# Altium schematic symbol library ISSI SRAM ASynchronous SRAM High Speed Low Power.SchLib: 414 symbols (part 3 of 16)
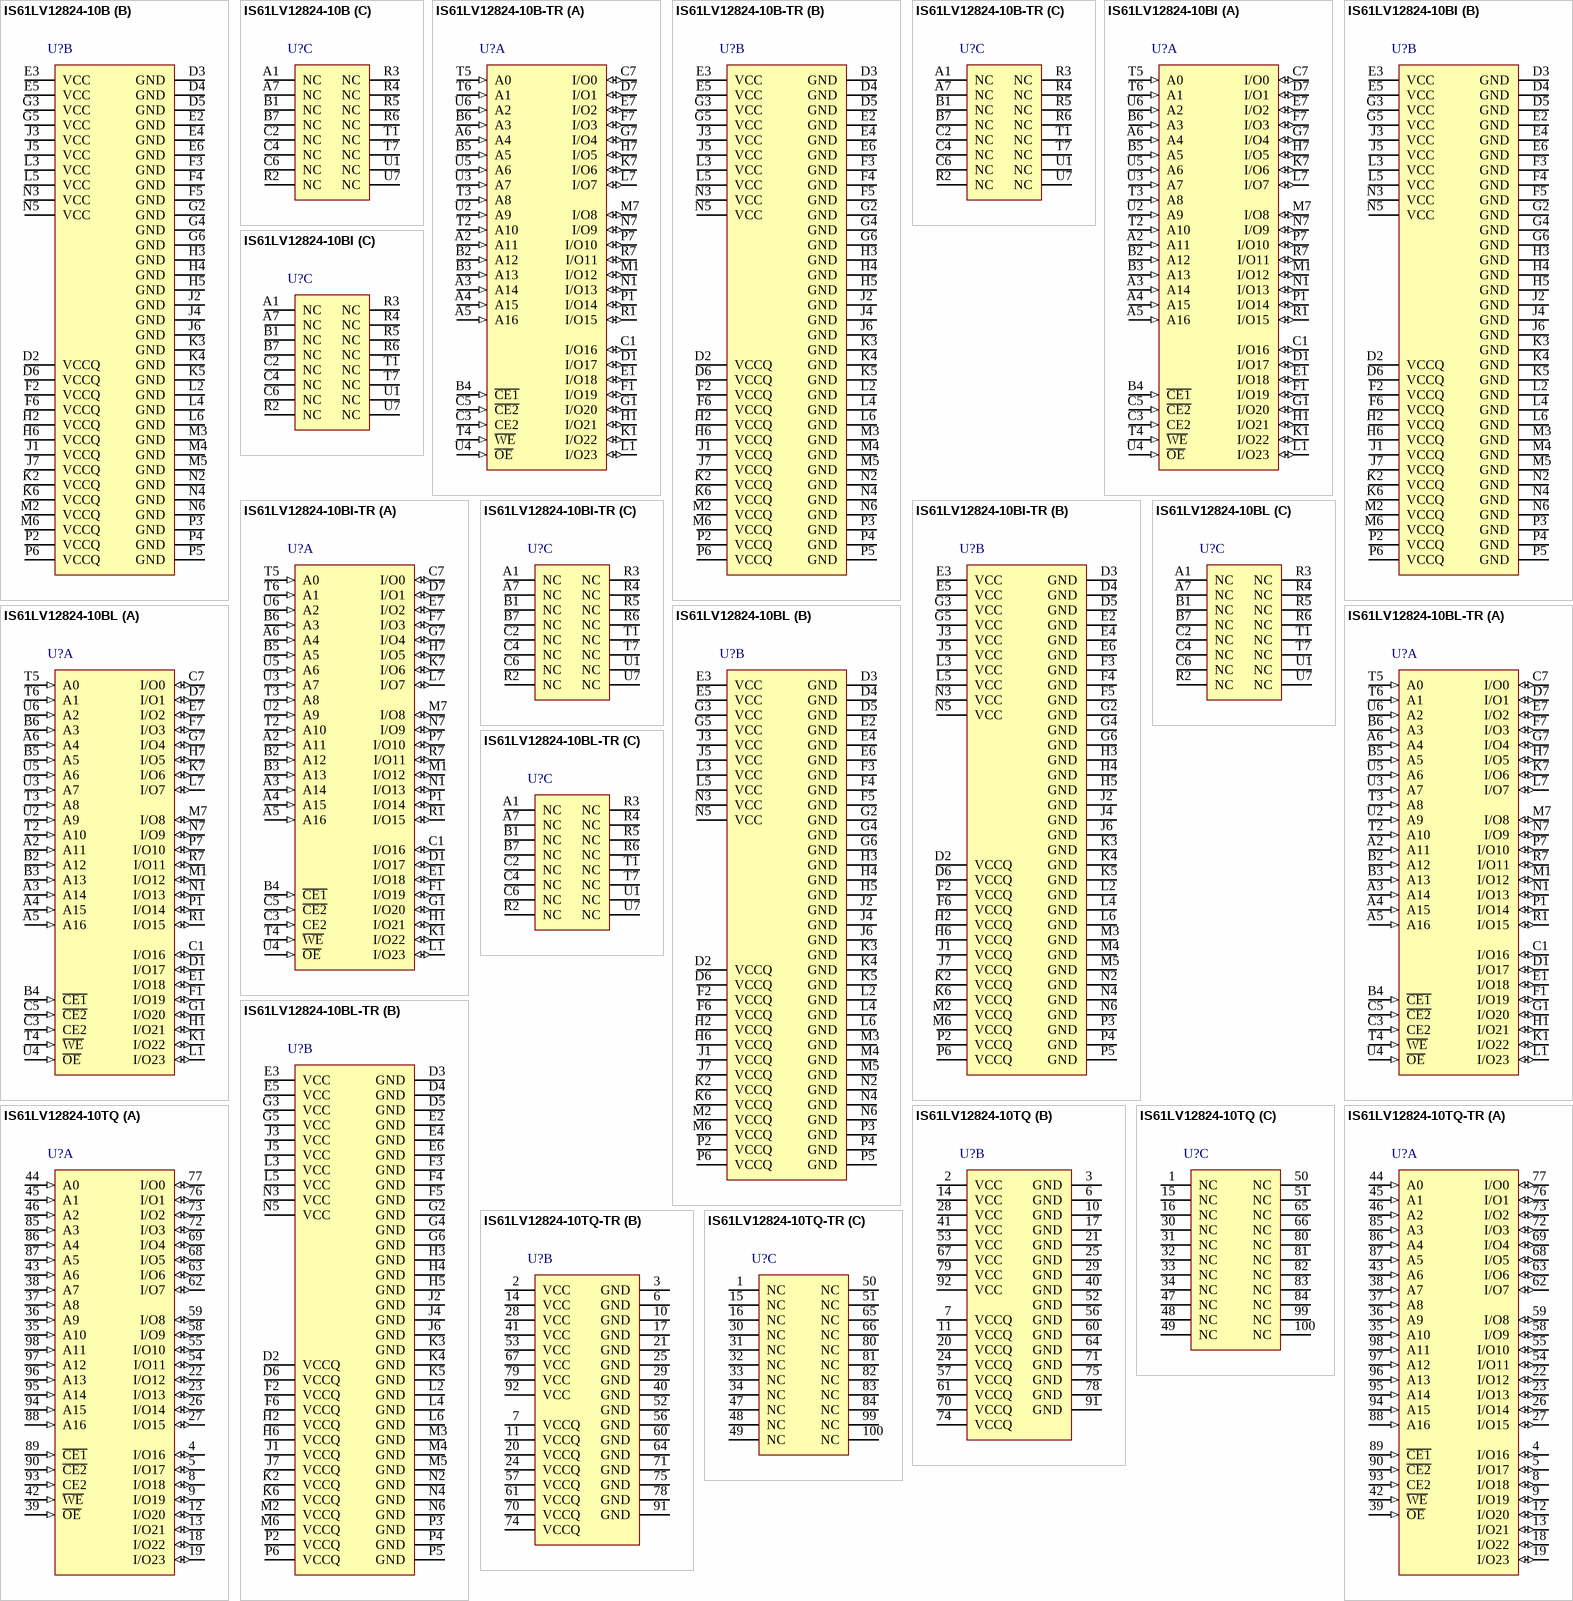
[diagram p30: symbols IS61LV12824-10B to IS61LV12824-10TQ-TR]

## IS61LV12824-10TQ
designator U?
3 M High Speed CMOS SRAM with 3.3 V Supply, 128 K x 24, 0 to 70 degC, 100-Pin QFP (TQFP-100); Manufacturer: Integrated Silicon Solution Inc (ISSI); PartNumber: IS61LV12824-10TQ; Density: 3M; Packing: Tray / Tube; Speed (ns): 10; DatasheetVersion: Rev. D; PackageVersion: Rev. F, 09/2009; PackageReference: TQFP-100; PackageDescription: 100-Pin 20 x 14 mm LQFP, Pitch 0.65 mm; Supplier 1: Digi-Key; Supplier Part Number 1: IS61LV12824-10TQ-ND; Supplier 2: Mouser; Supplier Part Number 2: 870-IS61LV12824-10TQ; Organization: 128K x 24; Mounting Technology: Surface Mount; ComponentLink1Description: Manufacturer URL; ComponentLink1URL: http://www.issi.com/US/index.shtml; ComponentLink2Description: Datasheet; ComponentLink2URL: http://www.issi.com/WW/pdf/61LV12824.pdf; ComponentLink3Description: Package Specification; ComponentLink3URL: http://www.issi.com/WW/pdf/61VPS_LPS25636A_51218A.pdf
footprint ISSI-TQFP-100-20000X14000DE_N (QFP, 100-Leads, Body 20x14mm, Pitch 0.65mm, IPC Medium Density)
part A pins: 4 I/O16 (io) "Data Input/Output", 5 I/O17 (io) "Data Input/Output", 8 I/O18 (io) "Data Input/Output", 9 I/O19 (io) "Data Input/Output", 12 I/O20 (io) "Data Input/Output", 13 I/O21 (io) "Data Input/Output", 18 I/O22 (io) "Data Input/Output", 19 I/O23 (io) "Data Input/Output", 22 I/O12 (io) "Data Input/Output", 23 I/O13 (io) "Data Input/Output", 26 I/O14 (io) "Data Input/Output", 27 I/O15 (io) "Data Input/Output", 35 A10 (in) "Address Input", 36 A9 (in) "Address Input", 37 A8 (in) "Address Input", 38 A7 (in) "Address Input", 39 ~{OE} (in) "Output Enable Input", 42 ~{WE} (in) "Write Enable Input", 43 A6 (in) "Address Input", 44 A0 (in) "Address Input", 45 A1 (in) "Address Input", 46 A2 (in) "Address Input", 54 I/O11 (io) "Data Input/Output", 55 I/O10 (io) "Data Input/Output", 58 I/O9 (io) "Data Input/Output", 59 I/O8 (io) "Data Input/Output", 62 I/O7 (io) "Data Input/Output", 63 I/O6 (io) "Data Input/Output", 68 I/O5 (io) "Data Input/Output", 69 I/O4 (io) "Data Input/Output", 72 I/O3 (io) "Data Input/Output", 73 I/O2 (io) "Data Input/Output", 76 I/O1 (io) "Data Input/Output", 77 I/O0 (io) "Data Input/Output", 85 A3 (in) "Address Input", 86 A4 (in) "Address Input", 87 A5 (in) "Address Input", 88 A16 (in) "Address Input", 89 ~{CE1} (in) "Chip Enable Input LOW", 90 ~{CE2} (in) "Chip Enable Input LOW", 93 CE2 (in) "Chip Enable Input HIGH", 94 A15 (in) "Address Input", 95 A14 (in) "Address Input", 96 A13 (in) "Address Input", 97 A12 (in) "Address Input", 98 A11 (in) "Address Input"
part B pins: 2 VCC (power) "Power", 3 GND (power) "Ground", 6 GND (power) "Ground", 7 VCCQ (power) "I/O Power", 10 GND (power) "Ground", 11 VCCQ (power) "I/O Power", 14 VCC (power) "Power", 17 GND (power) "Ground", 20 VCCQ (power) "I/O Power", 21 GND (power) "Ground", 24 VCCQ (power) "I/O Power", 25 GND (power) "Ground", 28 VCC (power) "Power", 29 GND (power) "Ground", 40 GND (power) "Ground", 41 VCC (power) "Power", 52 GND (power) "Ground", 53 VCC (power) "Power", 56 GND (power) "Ground", 57 VCCQ (power) "I/O Power", 60 GND (power) "Ground", 61 VCCQ (power) "I/O Power", 64 GND (power) "Ground", 67 VCC (power) "Power", 70 VCCQ (power) "I/O Power", 71 GND (power) "Ground", 74 VCCQ (power) "I/O Power", 75 GND (power) "Ground", 78 GND (power) "Ground", 79 VCC (power) "Power", 91 GND (power) "Ground", 92 VCC (power) "Power"
part C pins: 1 NC "No Connection", 15 NC "No Connection", 16 NC "No Connection", 30 NC "No Connection", 31 NC "No Connection", 32 NC "No Connection", 33 NC "No Connection", 34 NC "No Connection", 47 NC "No Connection", 48 NC "No Connection", 49 NC "No Connection", 50 NC "No Connection", 51 NC "No Connection", 65 NC "No Connection", 66 NC "No Connection", 80 NC "No Connection", 81 NC "No Connection", 82 NC "No Connection", 83 NC "No Connection", 84 NC "No Connection", 99 NC "No Connection", 100 NC "No Connection"

## IS61LV12824-10TQ-TR
designator U?
3 M High Speed CMOS SRAM with 3.3 V Supply, 128 K x 24, 0 to 70 degC, 100-Pin QFP (TQFP-100); Manufacturer: Integrated Silicon Solution Inc (ISSI); PartNumber: IS61LV12824-10TQ-TR; Density: 3M; Packing: Tape & Reel; Speed (ns): 10; DatasheetVersion: Rev. D; PackageVersion: Rev. F, 09/2009; PackageReference: TQFP-100; PackageDescription: 100-Pin 20 x 14 mm LQFP, Pitch 0.65 mm; Supplier 1: Digi-Key; Supplier Part Number 1: IS61LV12824-10TQ-TR-ND; Supplier 2: Mouser; Supplier Part Number 2: 870IS61LV1282410TQTR; Organization: 128K x 24; Mounting Technology: Surface Mount; ComponentLink1Description: Manufacturer URL; ComponentLink1URL: http://www.issi.com/US/index.shtml; ComponentLink2Description: Datasheet; ComponentLink2URL: http://www.issi.com/WW/pdf/61LV12824.pdf; ComponentLink3Description: Package Specification; ComponentLink3URL: http://www.issi.com/WW/pdf/61VPS_LPS25636A_51218A.pdf
footprint ISSI-TQFP-100-20000X14000DE_N (QFP, 100-Leads, Body 20x14mm, Pitch 0.65mm, IPC Medium Density)
part A pins: 4 I/O16 (io) "Data Input/Output", 5 I/O17 (io) "Data Input/Output", 8 I/O18 (io) "Data Input/Output", 9 I/O19 (io) "Data Input/Output", 12 I/O20 (io) "Data Input/Output", 13 I/O21 (io) "Data Input/Output", 18 I/O22 (io) "Data Input/Output", 19 I/O23 (io) "Data Input/Output", 22 I/O12 (io) "Data Input/Output", 23 I/O13 (io) "Data Input/Output", 26 I/O14 (io) "Data Input/Output", 27 I/O15 (io) "Data Input/Output", 35 A10 (in) "Address Input", 36 A9 (in) "Address Input", 37 A8 (in) "Address Input", 38 A7 (in) "Address Input", 39 ~{OE} (in) "Output Enable Input", 42 ~{WE} (in) "Write Enable Input", 43 A6 (in) "Address Input", 44 A0 (in) "Address Input", 45 A1 (in) "Address Input", 46 A2 (in) "Address Input", 54 I/O11 (io) "Data Input/Output", 55 I/O10 (io) "Data Input/Output", 58 I/O9 (io) "Data Input/Output", 59 I/O8 (io) "Data Input/Output", 62 I/O7 (io) "Data Input/Output", 63 I/O6 (io) "Data Input/Output", 68 I/O5 (io) "Data Input/Output", 69 I/O4 (io) "Data Input/Output", 72 I/O3 (io) "Data Input/Output", 73 I/O2 (io) "Data Input/Output", 76 I/O1 (io) "Data Input/Output", 77 I/O0 (io) "Data Input/Output", 85 A3 (in) "Address Input", 86 A4 (in) "Address Input", 87 A5 (in) "Address Input", 88 A16 (in) "Address Input", 89 ~{CE1} (in) "Chip Enable Input LOW", 90 ~{CE2} (in) "Chip Enable Input LOW", 93 CE2 (in) "Chip Enable Input HIGH", 94 A15 (in) "Address Input", 95 A14 (in) "Address Input", 96 A13 (in) "Address Input", 97 A12 (in) "Address Input", 98 A11 (in) "Address Input"
part B pins: 2 VCC (power) "Power", 3 GND (power) "Ground", 6 GND (power) "Ground", 7 VCCQ (power) "I/O Power", 10 GND (power) "Ground", 11 VCCQ (power) "I/O Power", 14 VCC (power) "Power", 17 GND (power) "Ground", 20 VCCQ (power) "I/O Power", 21 GND (power) "Ground", 24 VCCQ (power) "I/O Power", 25 GND (power) "Ground", 28 VCC (power) "Power", 29 GND (power) "Ground", 40 GND (power) "Ground", 41 VCC (power) "Power", 52 GND (power) "Ground", 53 VCC (power) "Power", 56 GND (power) "Ground", 57 VCCQ (power) "I/O Power", 60 GND (power) "Ground", 61 VCCQ (power) "I/O Power", 64 GND (power) "Ground", 67 VCC (power) "Power", 70 VCCQ (power) "I/O Power", 71 GND (power) "Ground", 74 VCCQ (power) "I/O Power", 75 GND (power) "Ground", 78 GND (power) "Ground", 79 VCC (power) "Power", 91 GND (power) "Ground", 92 VCC (power) "Power"
part C pins: 1 NC "No Connection", 15 NC "No Connection", 16 NC "No Connection", 30 NC "No Connection", 31 NC "No Connection", 32 NC "No Connection", 33 NC "No Connection", 34 NC "No Connection", 47 NC "No Connection", 48 NC "No Connection", 49 NC "No Connection", 50 NC "No Connection", 51 NC "No Connection", 65 NC "No Connection", 66 NC "No Connection", 80 NC "No Connection", 81 NC "No Connection", 82 NC "No Connection", 83 NC "No Connection", 84 NC "No Connection", 99 NC "No Connection", 100 NC "No Connection"

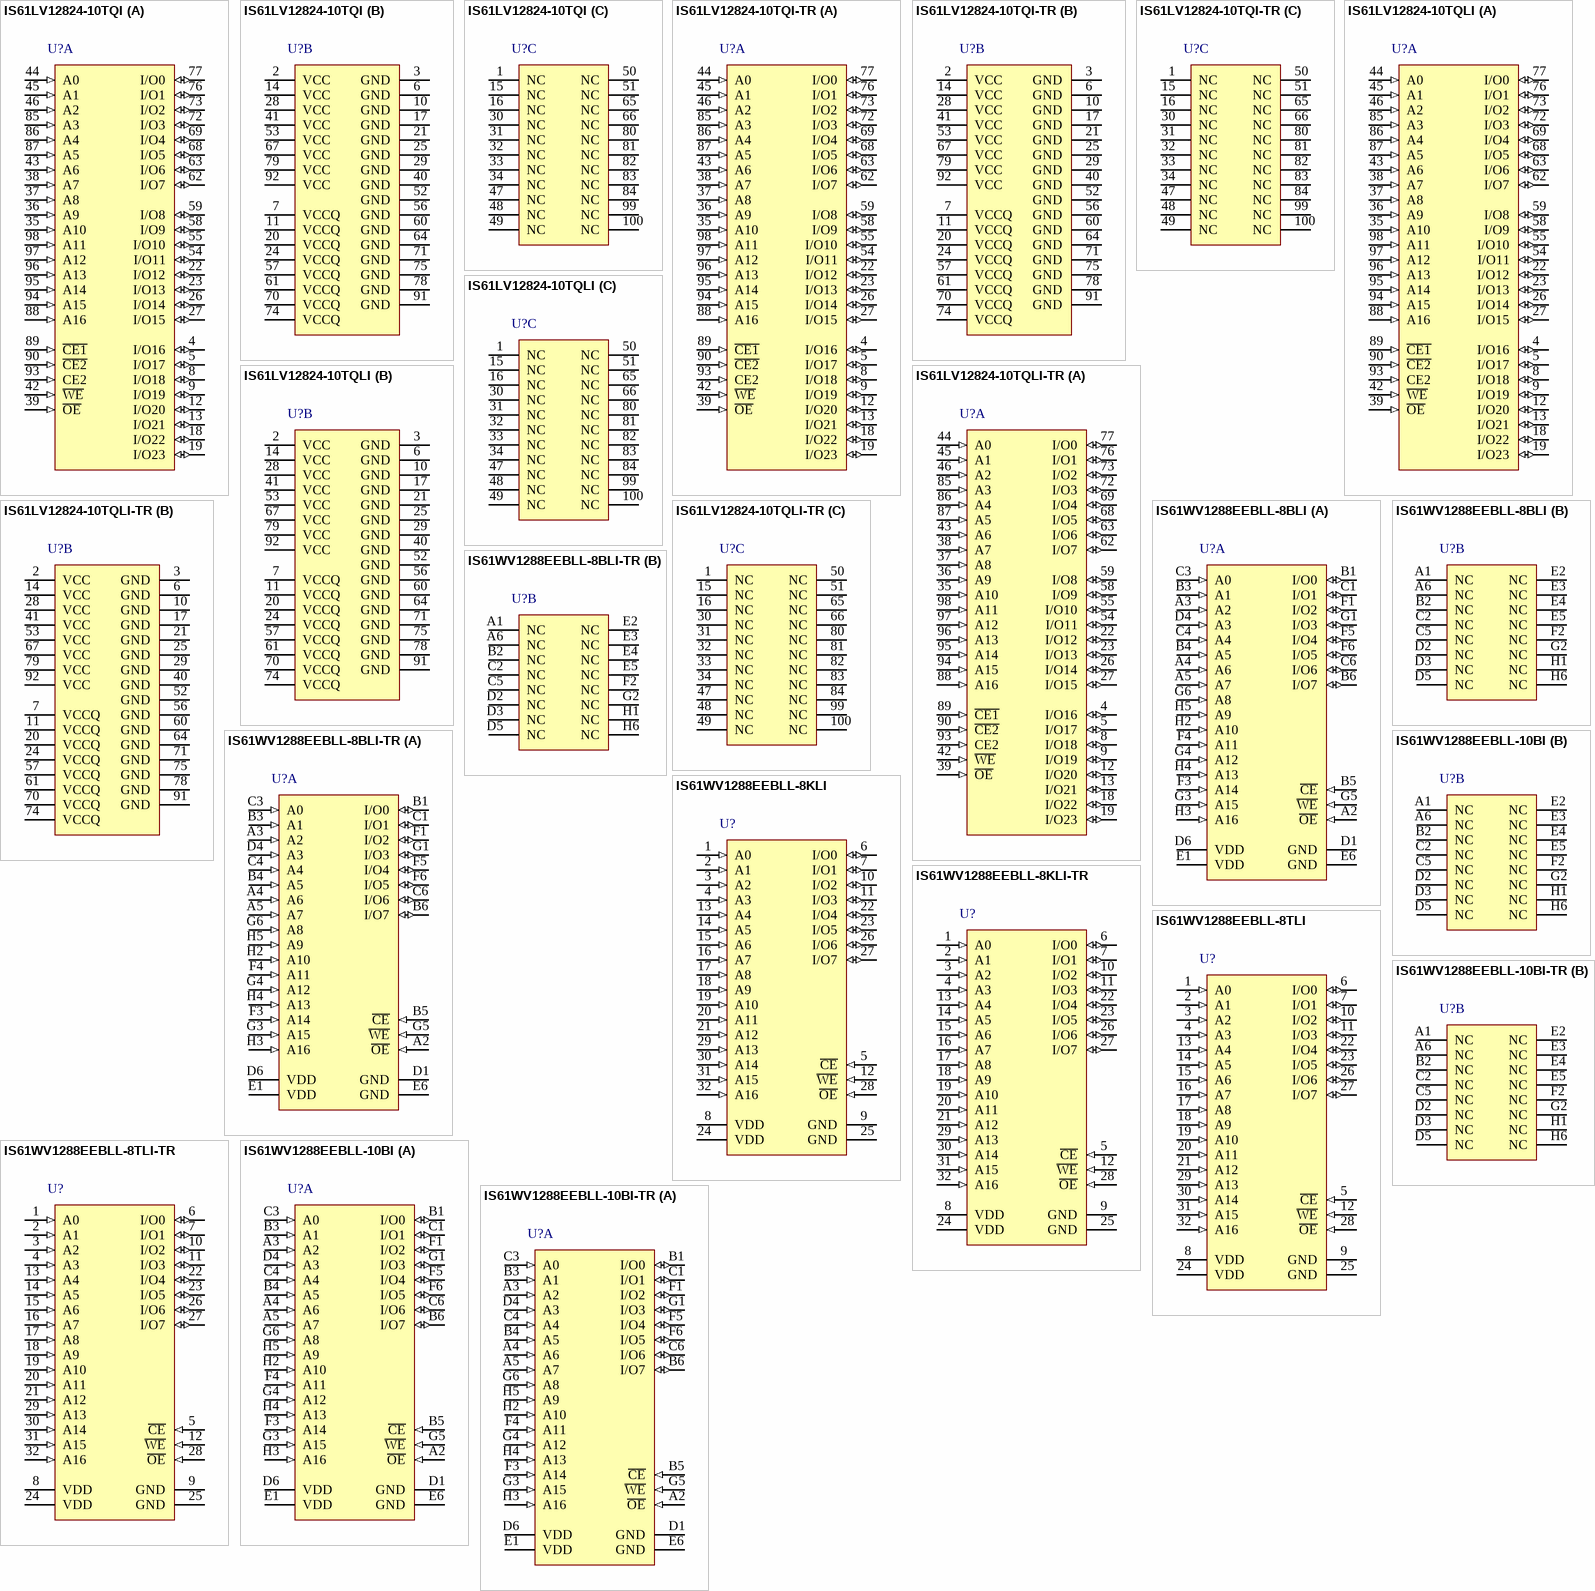
[diagram p4: symbols IS61LV12824-10TQI to IS61WV1288EEBLL-10BI-TR]

## IS61LV12824-10TQI
designator U?
3 M High Speed CMOS SRAM with 3.3 V Supply, 128 K x 24, -40 to 85 degC, 100-Pin QFP (TQFP-100); Manufacturer: Integrated Silicon Solution Inc (ISSI); PartNumber: IS61LV12824-10TQI; Density: 3M; Packing: Tray / Tube; Speed (ns): 10; DatasheetVersion: Rev. D; PackageVersion: Rev. F, 09/2009; PackageReference: TQFP-100; PackageDescription: 100-Pin 20 x 14 mm LQFP, Pitch 0.65 mm; Supplier 1: Digi-Key; Supplier Part Number 1: IS61LV12824-10TQI-ND; Supplier 2: Mouser; Supplier Part Number 2: 870IS61LV1282410TQI; Organization: 128K x 24; Mounting Technology: Surface Mount; ComponentLink1Description: Manufacturer URL; ComponentLink1URL: http://www.issi.com/US/index.shtml; ComponentLink2Description: Datasheet; ComponentLink2URL: http://www.issi.com/WW/pdf/61LV12824.pdf; ComponentLink3Description: Package Specification; ComponentLink3URL: http://www.issi.com/WW/pdf/61VPS_LPS25636A_51218A.pdf
footprint ISSI-TQFP-100-20000X14000DE_N (QFP, 100-Leads, Body 20x14mm, Pitch 0.65mm, IPC Medium Density)
part A pins: 4 I/O16 (io) "Data Input/Output", 5 I/O17 (io) "Data Input/Output", 8 I/O18 (io) "Data Input/Output", 9 I/O19 (io) "Data Input/Output", 12 I/O20 (io) "Data Input/Output", 13 I/O21 (io) "Data Input/Output", 18 I/O22 (io) "Data Input/Output", 19 I/O23 (io) "Data Input/Output", 22 I/O12 (io) "Data Input/Output", 23 I/O13 (io) "Data Input/Output", 26 I/O14 (io) "Data Input/Output", 27 I/O15 (io) "Data Input/Output", 35 A10 (in) "Address Input", 36 A9 (in) "Address Input", 37 A8 (in) "Address Input", 38 A7 (in) "Address Input", 39 ~{OE} (in) "Output Enable Input", 42 ~{WE} (in) "Write Enable Input", 43 A6 (in) "Address Input", 44 A0 (in) "Address Input", 45 A1 (in) "Address Input", 46 A2 (in) "Address Input", 54 I/O11 (io) "Data Input/Output", 55 I/O10 (io) "Data Input/Output", 58 I/O9 (io) "Data Input/Output", 59 I/O8 (io) "Data Input/Output", 62 I/O7 (io) "Data Input/Output", 63 I/O6 (io) "Data Input/Output", 68 I/O5 (io) "Data Input/Output", 69 I/O4 (io) "Data Input/Output", 72 I/O3 (io) "Data Input/Output", 73 I/O2 (io) "Data Input/Output", 76 I/O1 (io) "Data Input/Output", 77 I/O0 (io) "Data Input/Output", 85 A3 (in) "Address Input", 86 A4 (in) "Address Input", 87 A5 (in) "Address Input", 88 A16 (in) "Address Input", 89 ~{CE1} (in) "Chip Enable Input LOW", 90 ~{CE2} (in) "Chip Enable Input LOW", 93 CE2 (in) "Chip Enable Input HIGH", 94 A15 (in) "Address Input", 95 A14 (in) "Address Input", 96 A13 (in) "Address Input", 97 A12 (in) "Address Input", 98 A11 (in) "Address Input"
part B pins: 2 VCC (power) "Power", 3 GND (power) "Ground", 6 GND (power) "Ground", 7 VCCQ (power) "I/O Power", 10 GND (power) "Ground", 11 VCCQ (power) "I/O Power", 14 VCC (power) "Power", 17 GND (power) "Ground", 20 VCCQ (power) "I/O Power", 21 GND (power) "Ground", 24 VCCQ (power) "I/O Power", 25 GND (power) "Ground", 28 VCC (power) "Power", 29 GND (power) "Ground", 40 GND (power) "Ground", 41 VCC (power) "Power", 52 GND (power) "Ground", 53 VCC (power) "Power", 56 GND (power) "Ground", 57 VCCQ (power) "I/O Power", 60 GND (power) "Ground", 61 VCCQ (power) "I/O Power", 64 GND (power) "Ground", 67 VCC (power) "Power", 70 VCCQ (power) "I/O Power", 71 GND (power) "Ground", 74 VCCQ (power) "I/O Power", 75 GND (power) "Ground", 78 GND (power) "Ground", 79 VCC (power) "Power", 91 GND (power) "Ground", 92 VCC (power) "Power"
part C pins: 1 NC "No Connection", 15 NC "No Connection", 16 NC "No Connection", 30 NC "No Connection", 31 NC "No Connection", 32 NC "No Connection", 33 NC "No Connection", 34 NC "No Connection", 47 NC "No Connection", 48 NC "No Connection", 49 NC "No Connection", 50 NC "No Connection", 51 NC "No Connection", 65 NC "No Connection", 66 NC "No Connection", 80 NC "No Connection", 81 NC "No Connection", 82 NC "No Connection", 83 NC "No Connection", 84 NC "No Connection", 99 NC "No Connection", 100 NC "No Connection"

## IS61LV12824-10TQI-TR
designator U?
3 M High Speed CMOS SRAM with 3.3 V Supply, 128 K x 24, -40 to 85 degC, 100-Pin QFP (TQFP-100); Manufacturer: Integrated Silicon Solution Inc (ISSI); PartNumber: IS61LV12824-10TQI-TR; Density: 3M; Packing: Tape & Reel; Speed (ns): 10; DatasheetVersion: Rev. D; PackageVersion: Rev. F, 09/2009; PackageReference: TQFP-100; PackageDescription: 100-Pin 20 x 14 mm LQFP, Pitch 0.65 mm; Supplier 1: Digi-Key; Supplier Part Number 1: IS61LV12824-10TQI-TR-ND; Supplier 2: Mouser; Supplier Part Number 2: 870IS61LV1282410TQIT; Organization: 128K x 24; Mounting Technology: Surface Mount; ComponentLink1Description: Manufacturer URL; ComponentLink1URL: http://www.issi.com/US/index.shtml; ComponentLink2Description: Datasheet; ComponentLink2URL: http://www.issi.com/WW/pdf/61LV12824.pdf; ComponentLink3Description: Package Specification; ComponentLink3URL: http://www.issi.com/WW/pdf/61VPS_LPS25636A_51218A.pdf
footprint ISSI-TQFP-100-20000X14000DE_N (QFP, 100-Leads, Body 20x14mm, Pitch 0.65mm, IPC Medium Density)
part A pins: 4 I/O16 (io) "Data Input/Output", 5 I/O17 (io) "Data Input/Output", 8 I/O18 (io) "Data Input/Output", 9 I/O19 (io) "Data Input/Output", 12 I/O20 (io) "Data Input/Output", 13 I/O21 (io) "Data Input/Output", 18 I/O22 (io) "Data Input/Output", 19 I/O23 (io) "Data Input/Output", 22 I/O12 (io) "Data Input/Output", 23 I/O13 (io) "Data Input/Output", 26 I/O14 (io) "Data Input/Output", 27 I/O15 (io) "Data Input/Output", 35 A10 (in) "Address Input", 36 A9 (in) "Address Input", 37 A8 (in) "Address Input", 38 A7 (in) "Address Input", 39 ~{OE} (in) "Output Enable Input", 42 ~{WE} (in) "Write Enable Input", 43 A6 (in) "Address Input", 44 A0 (in) "Address Input", 45 A1 (in) "Address Input", 46 A2 (in) "Address Input", 54 I/O11 (io) "Data Input/Output", 55 I/O10 (io) "Data Input/Output", 58 I/O9 (io) "Data Input/Output", 59 I/O8 (io) "Data Input/Output", 62 I/O7 (io) "Data Input/Output", 63 I/O6 (io) "Data Input/Output", 68 I/O5 (io) "Data Input/Output", 69 I/O4 (io) "Data Input/Output", 72 I/O3 (io) "Data Input/Output", 73 I/O2 (io) "Data Input/Output", 76 I/O1 (io) "Data Input/Output", 77 I/O0 (io) "Data Input/Output", 85 A3 (in) "Address Input", 86 A4 (in) "Address Input", 87 A5 (in) "Address Input", 88 A16 (in) "Address Input", 89 ~{CE1} (in) "Chip Enable Input LOW", 90 ~{CE2} (in) "Chip Enable Input LOW", 93 CE2 (in) "Chip Enable Input HIGH", 94 A15 (in) "Address Input", 95 A14 (in) "Address Input", 96 A13 (in) "Address Input", 97 A12 (in) "Address Input", 98 A11 (in) "Address Input"
part B pins: 2 VCC (power) "Power", 3 GND (power) "Ground", 6 GND (power) "Ground", 7 VCCQ (power) "I/O Power", 10 GND (power) "Ground", 11 VCCQ (power) "I/O Power", 14 VCC (power) "Power", 17 GND (power) "Ground", 20 VCCQ (power) "I/O Power", 21 GND (power) "Ground", 24 VCCQ (power) "I/O Power", 25 GND (power) "Ground", 28 VCC (power) "Power", 29 GND (power) "Ground", 40 GND (power) "Ground", 41 VCC (power) "Power", 52 GND (power) "Ground", 53 VCC (power) "Power", 56 GND (power) "Ground", 57 VCCQ (power) "I/O Power", 60 GND (power) "Ground", 61 VCCQ (power) "I/O Power", 64 GND (power) "Ground", 67 VCC (power) "Power", 70 VCCQ (power) "I/O Power", 71 GND (power) "Ground", 74 VCCQ (power) "I/O Power", 75 GND (power) "Ground", 78 GND (power) "Ground", 79 VCC (power) "Power", 91 GND (power) "Ground", 92 VCC (power) "Power"
part C pins: 1 NC "No Connection", 15 NC "No Connection", 16 NC "No Connection", 30 NC "No Connection", 31 NC "No Connection", 32 NC "No Connection", 33 NC "No Connection", 34 NC "No Connection", 47 NC "No Connection", 48 NC "No Connection", 49 NC "No Connection", 50 NC "No Connection", 51 NC "No Connection", 65 NC "No Connection", 66 NC "No Connection", 80 NC "No Connection", 81 NC "No Connection", 82 NC "No Connection", 83 NC "No Connection", 84 NC "No Connection", 99 NC "No Connection", 100 NC "No Connection"

## IS61LV12824-10TQLI
designator U?
3 M High Speed CMOS SRAM with 3.3 V Supply, 128 K x 24, -40 to 85 degC, 100-Pin QFP (TQFP-100), Pb-Free; Manufacturer: Integrated Silicon Solution Inc (ISSI); PartNumber: IS61LV12824-10TQLI; Density: 3M; Packing: Tray / Tube; Speed (ns): 10; DatasheetVersion: Rev. D; PackageVersion: Rev. F, 09/2009; PackageReference: TQFP-100; PackageDescription: 100-Pin 20 x 14 mm LQFP, Pitch 0.65 mm; Supplier 1: Digi-Key; Supplier Part Number 1: IS61LV12824-10TQLI-ND; Supplier 2: Mouser; Supplier Part Number 2: 870IS61LV1282410TQLI; Organization: 128K x 24; RoHS: Pb-Free; Mounting Technology: Surface Mount; ComponentLink1Description: Manufacturer URL; ComponentLink1URL: http://www.issi.com/US/index.shtml; ComponentLink2Description: Datasheet; ComponentLink2URL: http://www.issi.com/WW/pdf/61LV12824.pdf; ComponentLink3Description: Package Specification; ComponentLink3URL: http://www.issi.com/WW/pdf/61VPS_LPS25636A_51218A.pdf
footprint ISSI-TQFP-100-20000X14000DE_N (QFP, 100-Leads, Body 20x14mm, Pitch 0.65mm, IPC Medium Density)
part A pins: 4 I/O16 (io) "Data Input/Output", 5 I/O17 (io) "Data Input/Output", 8 I/O18 (io) "Data Input/Output", 9 I/O19 (io) "Data Input/Output", 12 I/O20 (io) "Data Input/Output", 13 I/O21 (io) "Data Input/Output", 18 I/O22 (io) "Data Input/Output", 19 I/O23 (io) "Data Input/Output", 22 I/O12 (io) "Data Input/Output", 23 I/O13 (io) "Data Input/Output", 26 I/O14 (io) "Data Input/Output", 27 I/O15 (io) "Data Input/Output", 35 A10 (in) "Address Input", 36 A9 (in) "Address Input", 37 A8 (in) "Address Input", 38 A7 (in) "Address Input", 39 ~{OE} (in) "Output Enable Input", 42 ~{WE} (in) "Write Enable Input", 43 A6 (in) "Address Input", 44 A0 (in) "Address Input", 45 A1 (in) "Address Input", 46 A2 (in) "Address Input", 54 I/O11 (io) "Data Input/Output", 55 I/O10 (io) "Data Input/Output", 58 I/O9 (io) "Data Input/Output", 59 I/O8 (io) "Data Input/Output", 62 I/O7 (io) "Data Input/Output", 63 I/O6 (io) "Data Input/Output", 68 I/O5 (io) "Data Input/Output", 69 I/O4 (io) "Data Input/Output", 72 I/O3 (io) "Data Input/Output", 73 I/O2 (io) "Data Input/Output", 76 I/O1 (io) "Data Input/Output", 77 I/O0 (io) "Data Input/Output", 85 A3 (in) "Address Input", 86 A4 (in) "Address Input", 87 A5 (in) "Address Input", 88 A16 (in) "Address Input", 89 ~{CE1} (in) "Chip Enable Input LOW", 90 ~{CE2} (in) "Chip Enable Input LOW", 93 CE2 (in) "Chip Enable Input HIGH", 94 A15 (in) "Address Input", 95 A14 (in) "Address Input", 96 A13 (in) "Address Input", 97 A12 (in) "Address Input", 98 A11 (in) "Address Input"
part B pins: 2 VCC (power) "Power", 3 GND (power) "Ground", 6 GND (power) "Ground", 7 VCCQ (power) "I/O Power", 10 GND (power) "Ground", 11 VCCQ (power) "I/O Power", 14 VCC (power) "Power", 17 GND (power) "Ground", 20 VCCQ (power) "I/O Power", 21 GND (power) "Ground", 24 VCCQ (power) "I/O Power", 25 GND (power) "Ground", 28 VCC (power) "Power", 29 GND (power) "Ground", 40 GND (power) "Ground", 41 VCC (power) "Power", 52 GND (power) "Ground", 53 VCC (power) "Power", 56 GND (power) "Ground", 57 VCCQ (power) "I/O Power", 60 GND (power) "Ground", 61 VCCQ (power) "I/O Power", 64 GND (power) "Ground", 67 VCC (power) "Power", 70 VCCQ (power) "I/O Power", 71 GND (power) "Ground", 74 VCCQ (power) "I/O Power", 75 GND (power) "Ground", 78 GND (power) "Ground", 79 VCC (power) "Power", 91 GND (power) "Ground", 92 VCC (power) "Power"
part C pins: 1 NC "No Connection", 15 NC "No Connection", 16 NC "No Connection", 30 NC "No Connection", 31 NC "No Connection", 32 NC "No Connection", 33 NC "No Connection", 34 NC "No Connection", 47 NC "No Connection", 48 NC "No Connection", 49 NC "No Connection", 50 NC "No Connection", 51 NC "No Connection", 65 NC "No Connection", 66 NC "No Connection", 80 NC "No Connection", 81 NC "No Connection", 82 NC "No Connection", 83 NC "No Connection", 84 NC "No Connection", 99 NC "No Connection", 100 NC "No Connection"

## IS61LV12824-10TQLI-TR
designator U?
3 M High Speed CMOS SRAM with 3.3 V Supply, 128 K x 24, -40 to 85 degC, 100-Pin QFP (TQFP-100), Pb-Free; Manufacturer: Integrated Silicon Solution Inc (ISSI); PartNumber: IS61LV12824-10TQLI-TR; Density: 3M; Packing: Tape & Reel; Speed (ns): 10; DatasheetVersion: Rev. D; PackageVersion: Rev. F, 09/2009; PackageReference: TQFP-100; PackageDescription: 100-Pin 20 x 14 mm LQFP, Pitch 0.65 mm; Supplier 1: Digi-Key; Supplier Part Number 1: IS61LV12824-10TQLI-TR-ND; Supplier 2: Mouser; Supplier Part Number 2: 87061LV1282410TQLIT; Organization: 128K x 24; RoHS: Pb-Free; Mounting Technology: Surface Mount; ComponentLink1Description: Manufacturer URL; ComponentLink1URL: http://www.issi.com/US/index.shtml; ComponentLink2Description: Datasheet; ComponentLink2URL: http://www.issi.com/WW/pdf/61LV12824.pdf; ComponentLink3Description: Package Specification; ComponentLink3URL: http://www.issi.com/WW/pdf/61VPS_LPS25636A_51218A.pdf
footprint ISSI-TQFP-100-20000X14000DE_N (QFP, 100-Leads, Body 20x14mm, Pitch 0.65mm, IPC Medium Density)
part A pins: 4 I/O16 (io) "Data Input/Output", 5 I/O17 (io) "Data Input/Output", 8 I/O18 (io) "Data Input/Output", 9 I/O19 (io) "Data Input/Output", 12 I/O20 (io) "Data Input/Output", 13 I/O21 (io) "Data Input/Output", 18 I/O22 (io) "Data Input/Output", 19 I/O23 (io) "Data Input/Output", 22 I/O12 (io) "Data Input/Output", 23 I/O13 (io) "Data Input/Output", 26 I/O14 (io) "Data Input/Output", 27 I/O15 (io) "Data Input/Output", 35 A10 (in) "Address Input", 36 A9 (in) "Address Input", 37 A8 (in) "Address Input", 38 A7 (in) "Address Input", 39 ~{OE} (in) "Output Enable Input", 42 ~{WE} (in) "Write Enable Input", 43 A6 (in) "Address Input", 44 A0 (in) "Address Input", 45 A1 (in) "Address Input", 46 A2 (in) "Address Input", 54 I/O11 (io) "Data Input/Output", 55 I/O10 (io) "Data Input/Output", 58 I/O9 (io) "Data Input/Output", 59 I/O8 (io) "Data Input/Output", 62 I/O7 (io) "Data Input/Output", 63 I/O6 (io) "Data Input/Output", 68 I/O5 (io) "Data Input/Output", 69 I/O4 (io) "Data Input/Output", 72 I/O3 (io) "Data Input/Output", 73 I/O2 (io) "Data Input/Output", 76 I/O1 (io) "Data Input/Output", 77 I/O0 (io) "Data Input/Output", 85 A3 (in) "Address Input", 86 A4 (in) "Address Input", 87 A5 (in) "Address Input", 88 A16 (in) "Address Input", 89 ~{CE1} (in) "Chip Enable Input LOW", 90 ~{CE2} (in) "Chip Enable Input LOW", 93 CE2 (in) "Chip Enable Input HIGH", 94 A15 (in) "Address Input", 95 A14 (in) "Address Input", 96 A13 (in) "Address Input", 97 A12 (in) "Address Input", 98 A11 (in) "Address Input"
part B pins: 2 VCC (power) "Power", 3 GND (power) "Ground", 6 GND (power) "Ground", 7 VCCQ (power) "I/O Power", 10 GND (power) "Ground", 11 VCCQ (power) "I/O Power", 14 VCC (power) "Power", 17 GND (power) "Ground", 20 VCCQ (power) "I/O Power", 21 GND (power) "Ground", 24 VCCQ (power) "I/O Power", 25 GND (power) "Ground", 28 VCC (power) "Power", 29 GND (power) "Ground", 40 GND (power) "Ground", 41 VCC (power) "Power", 52 GND (power) "Ground", 53 VCC (power) "Power", 56 GND (power) "Ground", 57 VCCQ (power) "I/O Power", 60 GND (power) "Ground", 61 VCCQ (power) "I/O Power", 64 GND (power) "Ground", 67 VCC (power) "Power", 70 VCCQ (power) "I/O Power", 71 GND (power) "Ground", 74 VCCQ (power) "I/O Power", 75 GND (power) "Ground", 78 GND (power) "Ground", 79 VCC (power) "Power", 91 GND (power) "Ground", 92 VCC (power) "Power"
part C pins: 1 NC "No Connection", 15 NC "No Connection", 16 NC "No Connection", 30 NC "No Connection", 31 NC "No Connection", 32 NC "No Connection", 33 NC "No Connection", 34 NC "No Connection", 47 NC "No Connection", 48 NC "No Connection", 49 NC "No Connection", 50 NC "No Connection", 51 NC "No Connection", 65 NC "No Connection", 66 NC "No Connection", 80 NC "No Connection", 81 NC "No Connection", 82 NC "No Connection", 83 NC "No Connection", 84 NC "No Connection", 99 NC "No Connection", 100 NC "No Connection"

## IS61WV1288EEBLL-8BLI
designator U?
1 M High Speed Asynchronous CMOS SRAM with ECC, 128 K x 8, -40 to 85 degC, 48-Pin BGA (TF-BGA-48), Pb-Free; Manufacturer: Integrated Silicon Solution Inc (ISSI); PartNumber: IS61WV1288EEBLL-8BLI; Density: 1M; Organization: 128K x 8; Packing: Tray / Tube; Speed (ns): 8; DatasheetVersion: Rev. A; PackageVersion: Rev. C, 08/2008; PackageReference: TF-BGA-48; PackageDescription: 48-Pin 6 x 8 mm TF-BGA, Pitch 0.75 mm; RoHS: Pb-Free; Mounting Technology: Surface Mount; Code_JEDEC: MO-207; ComponentLink1Description: Manufacturer URL; ComponentLink1URL: http://www.issi.com/US/index.shtml; ComponentLink2Description: Datasheet; ComponentLink2URL: http://www.issi.com/WW/pdf/61-64WV1288EEBLL.pdf; ComponentLink3Description: Package Specification; ComponentLink3URL: http://www.issi.com/WW/pdf/61-64WV25616.pdf
footprint ISSI-TF-BGA-48-6000X8000DE (BGA, 48-Balls, Body 8x6mm, Pitch 0.75mm)
part A pins: A2 ~{OE} (in) "Output Enable Input", A3 A2 (in) "Address Input", A4 A6 (in) "Address Input", A5 A7 (in) "Address Input", B1 I/O0 (io) "Bidirectional Port", B3 A1 (in) "Address Input", B4 A5 (in) "Address Input", B5 ~{CE} (in) "Chip Enable Input", B6 I/O7 (io) "Bidirectional Port", C1 I/O1 (io) "Bidirectional Port", C3 A0 (in) "Address Input", C4 A4 (in) "Address Input", C6 I/O6 (io) "Bidirectional Port", D1 GND (power) "Ground", D4 A3 (in) "Address Input", D6 VDD (power) "Power", E1 VDD (power) "Power", E6 GND (power) "Ground", F1 I/O2 (io) "Bidirectional Port", F3 A14 (in) "Address Input", F4 A11 (in) "Address Input", F5 I/O4 (io) "Bidirectional Port", F6 I/O5 (io) "Bidirectional Port", G1 I/O3 (io) "Bidirectional Port", G3 A15 (in) "Address Input", G4 A12 (in) "Address Input", G5 ~{WE} (in) "Write Enable Input", G6 A8 (in) "Address Input", H2 A10 (in) "Address Input", H3 A16 (in) "Address Input", H4 A13 (in) "Address Input", H5 A9 (in) "Address Input"
part B pins: A1 NC "No Connection", A6 NC "No Connection", B2 NC "No Connection", C2 NC "No Connection", C5 NC "No Connection", D2 NC "No Connection", D3 NC "No Connection", D5 NC "No Connection", E2 NC "No Connection", E3 NC "No Connection", E4 NC "No Connection", E5 NC "No Connection", F2 NC "No Connection", G2 NC "No Connection", H1 NC "No Connection", H6 NC "No Connection"
